# Altium footprint library Switches.PcbLib: 117 footprints (part 6 of 8)
Each footprint in its own frame and in the unit in brackets; x right, y up, seen from the top. Pads: shape width x height; smd on the part's side, far side on the other; paste and mask are expansions set on the pad; w line width, h text height; cw(c..) or ccw(c..) is an arc to the next point about the centre after c.
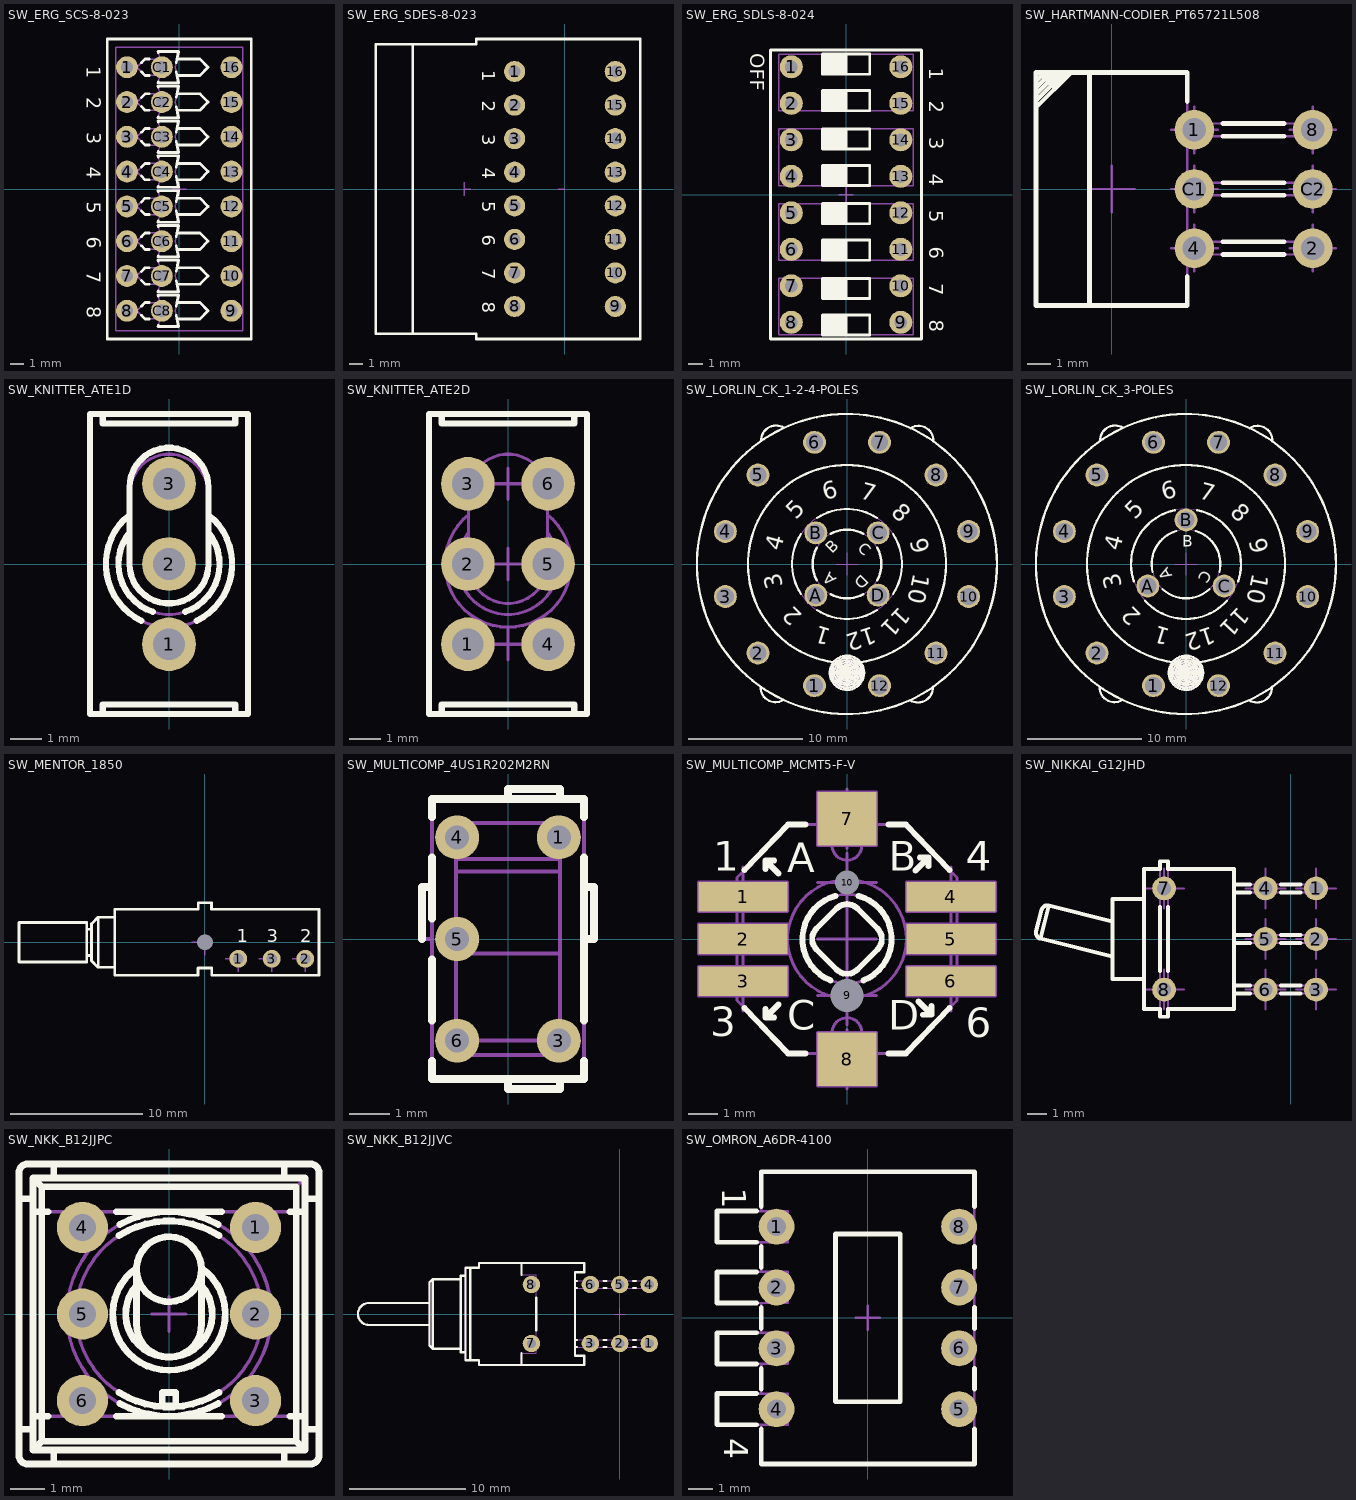
[diagram p5: the footprints below, top view; thin cyan lines are the x and y axes]

## SW_ERG_SCS-8-023 [mm] "Body 21.9x10.5mm, Pitch 2.54mm, 8 Way SPDT, Thru Hole DIP Switch, ERG Spectra C-023 Style"
height 9
pads (24):
  round 1.6 hole 0.9: 1(-3.81,8.89) 2(-3.81,6.35) 3(-3.81,3.81) 4(-3.81,1.27) 5(-3.81,-1.27) 6(-3.81,-3.81) 7(-3.81,-6.35) 8(-3.81,-8.89) 9(3.81,-8.89) 10(3.81,-6.35) 11(3.81,-3.81) 12(3.81,-1.27) 13(3.81,1.27) 14(3.81,3.81) 15(3.81,6.35) 16(3.81,8.89) C1(-1.27,8.89) C2(-1.27,6.35) C3(-1.27,3.81) C4(-1.27,1.27) C5(-1.27,-1.27) C6(-1.27,-3.81) C7(-1.27,-6.35) C8(-1.27,-8.89)
Top Overlay:
  lines w0.2: -2.761,-9.219 -2.49,-9.49 -2.192,-9.49 ; -2.761,-8.561 -2.49,-8.29 -2.192,-8.29 ; -2.761,-6.679 -2.49,-6.95 -2.192,-6.95 ; -2.761,-6.021 -2.49,-5.75 -2.192,-5.75 ; -2.761,-4.139 -2.49,-4.41 -2.192,-4.41 ; -2.761,-3.481 -2.49,-3.21 -2.192,-3.21 ; -2.761,-1.599 -2.49,-1.87 -2.192,-1.87 ; -2.761,-0.941 -2.49,-0.67 -2.192,-0.67 ; -2.761,0.941 -2.49,0.67 -2.192,0.67 ; -2.761,1.599 -2.49,1.87 -2.192,1.87 ; -2.761,3.481 -2.49,3.21 -2.192,3.21 ; -2.761,4.139 -2.49,4.41 -2.192,4.41 ; -2.761,6.021 -2.49,5.75 -2.192,5.75 ; -2.761,6.679 -2.49,6.95 -2.192,6.95 ; -2.761,8.561 -2.49,8.29 -2.192,8.29 ; -2.761,9.219 -2.49,9.49 -2.192,9.49 ; -1.532,-9.958 -1.55,-10.04 -0.05,-10.04 -0.225,-9.234 ; -1.532,-7.822 -1.55,-7.74 -0.05,-7.74 -0.225,-8.546 ; -1.532,-7.418 -1.55,-7.5 -0.05,-7.5 -0.225,-6.694 ; -1.532,-5.282 -1.55,-5.2 -0.05,-5.2 -0.225,-6.006 ; -1.532,-4.878 -1.55,-4.96 -0.05,-4.96 -0.225,-4.154 ; -1.532,-2.742 -1.55,-2.66 -0.05,-2.66 -0.225,-3.466 ; -1.532,-2.338 -1.55,-2.42 -0.05,-2.42 -0.225,-1.614 ; -1.532,-0.202 -1.55,-0.12 -0.05,-0.12 -0.225,-0.926 ; -1.532,0.202 -1.55,0.12 -0.05,0.12 -0.225,0.926 ; -1.532,2.338 -1.55,2.42 -0.05,2.42 -0.225,1.614 ; -1.532,2.742 -1.55,2.66 -0.05,2.66 -0.225,3.466 ; -1.532,4.878 -1.55,4.96 -0.05,4.96 -0.225,4.154 ; -1.532,5.282 -1.55,5.2 -0.05,5.2 -0.225,6.006 ; -1.532,7.418 -1.55,7.5 -0.05,7.5 -0.225,6.694 ; -1.532,7.822 -1.55,7.74 -0.05,7.74 -0.225,8.546 ; -1.532,9.958 -1.55,10.04 -0.05,10.04 -0.225,9.234 ; -0.17,-9.49 1.51,-9.49 2.11,-8.89 1.51,-8.29 -0.17,-8.29 ; -0.17,-6.95 1.51,-6.95 2.11,-6.35 1.51,-5.75 -0.17,-5.75 ; -0.17,-4.41 1.51,-4.41 2.11,-3.81 1.51,-3.21 -0.17,-3.21 ; -0.17,-1.87 1.51,-1.87 2.11,-1.27 1.51,-0.67 -0.17,-0.67 ; -0.17,0.67 1.51,0.67 2.11,1.27 1.51,1.87 -0.17,1.87 ; -0.17,3.21 1.51,3.21 2.11,3.81 1.51,4.41 -0.17,4.41 ; -0.17,5.75 1.51,5.75 2.11,6.35 1.51,6.95 -0.17,6.95 ; -0.17,8.29 1.51,8.29 2.11,8.89 1.51,9.49 -0.17,9.49 ; -5.25,-10.95 5.25,-10.95 5.25,10.95 -5.25,10.95 -5.25,-10.95
  text "1" at -6.75,8.977 h1
  text "3" at -6.75,4.151 h1
  text "2" at -6.75,6.691 h1
  text "5" at -6.75,-0.929 h1
  text "4" at -6.75,1.611 h1
  text "6" at -6.75,-3.469 h1
  text "7" at -6.75,-6.009 h1
  text "8" at -6.75,-8.549 h1
Mechanical 8:
  lines w0.1: -4.31,-8.89 -3.81,-8.89 ; -4.31,-6.35 -3.81,-6.35 ; -4.31,-3.81 -3.81,-3.81 ; -4.31,-1.27 -3.81,-1.27 ; -4.31,1.27 -3.81,1.27 ; -4.31,3.81 -3.81,3.81 ; -4.31,6.35 -3.81,6.35 ; -4.31,8.89 -3.81,8.89 ; -3.81,-9.39 -3.81,-8.89 ; -3.81,-8.39 -3.81,-8.89 ; -3.81,-6.85 -3.81,-6.35 ; -3.81,-5.85 -3.81,-6.35 ; -3.81,-4.31 -3.81,-3.81 ; -3.81,-3.31 -3.81,-3.81 ; -3.81,-1.77 -3.81,-1.27 ; -3.81,-0.77 -3.81,-1.27 ; -3.81,0.77 -3.81,1.27 ; -3.81,1.77 -3.81,1.27 ; -3.81,3.31 -3.81,3.81 ; -3.81,4.31 -3.81,3.81 ; -3.81,5.85 -3.81,6.35 ; -3.81,6.85 -3.81,6.35 ; -3.81,8.39 -3.81,8.89 ; -3.81,9.39 -3.81,8.89 ; -3.31,-8.89 -3.81,-8.89 ; -3.31,-6.35 -3.81,-6.35 ; -3.31,-3.81 -3.81,-3.81 ; -3.31,-1.27 -3.81,-1.27 ; -3.31,1.27 -3.81,1.27 ; -3.31,3.81 -3.81,3.81 ; -3.31,6.35 -3.81,6.35 ; -3.31,8.89 -3.81,8.89 ; -1.77,-8.89 -1.27,-8.89 ; -1.77,-6.35 -1.27,-6.35 ; -1.77,-3.81 -1.27,-3.81 ; -1.77,-1.27 -1.27,-1.27 ; -1.77,1.27 -1.27,1.27 ; -1.77,3.81 -1.27,3.81 ; -1.77,6.35 -1.27,6.35 ; -1.77,8.89 -1.27,8.89 ; -1.27,-9.39 -1.27,-8.89 ; -1.27,-8.39 -1.27,-8.89 ; -1.27,-6.85 -1.27,-6.35 ; -1.27,-5.85 -1.27,-6.35 ; -1.27,-4.31 -1.27,-3.81 ; -1.27,-3.31 -1.27,-3.81 ; -1.27,-1.77 -1.27,-1.27 ; -1.27,-0.77 -1.27,-1.27 ; -1.27,0.77 -1.27,1.27 ; -1.27,1.77 -1.27,1.27 ; -1.27,3.31 -1.27,3.81 ; -1.27,4.31 -1.27,3.81 ; -1.27,5.85 -1.27,6.35 ; -1.27,6.85 -1.27,6.35 ; -1.27,8.39 -1.27,8.89 ; -1.27,9.39 -1.27,8.89 ; -0.77,-8.89 -1.27,-8.89 ; -0.77,-6.35 -1.27,-6.35 ; -0.77,-3.81 -1.27,-3.81 ; -0.77,-1.27 -1.27,-1.27 ; -0.77,1.27 -1.27,1.27 ; -0.77,3.81 -1.27,3.81 ; -0.77,6.35 -1.27,6.35 ; -0.77,8.89 -1.27,8.89 ; -0.5,0 0,0 ; 0,-0.5 0,0 ; 0,0.5 0,0 ; 0.5,0 0,0 ; 3.31,-8.89 3.81,-8.89 ; 3.31,-6.35 3.81,-6.35 ; 3.31,-3.81 3.81,-3.81 ; 3.31,-1.27 3.81,-1.27 ; 3.31,1.27 3.81,1.27 ; 3.31,3.81 3.81,3.81 ; 3.31,6.35 3.81,6.35 ; 3.31,8.89 3.81,8.89 ; 3.81,-9.39 3.81,-8.89 ; 3.81,-8.39 3.81,-8.89 ; 3.81,-6.85 3.81,-6.35 ; 3.81,-5.85 3.81,-6.35 ; 3.81,-4.31 3.81,-3.81 ; 3.81,-3.31 3.81,-3.81 ; 3.81,-1.77 3.81,-1.27 ; 3.81,-0.77 3.81,-1.27 ; 3.81,0.77 3.81,1.27 ; 3.81,1.77 3.81,1.27 ; 3.81,3.31 3.81,3.81 ; 3.81,4.31 3.81,3.81 ; 3.81,5.85 3.81,6.35 ; 3.81,6.85 3.81,6.35 ; 3.81,8.39 3.81,8.89 ; 3.81,9.39 3.81,8.89 ; 4.31,-8.89 3.81,-8.89 ; 4.31,-6.35 3.81,-6.35 ; 4.31,-3.81 3.81,-3.81 ; 4.31,-1.27 3.81,-1.27 ; 4.31,1.27 3.81,1.27 ; 4.31,3.81 3.81,3.81 ; 4.31,6.35 3.81,6.35 ; 4.31,8.89 3.81,8.89
Mechanical 14:
  lines w0.1: -1.43,-9.49 -2.49,-9.49 -3.09,-8.89 -2.49,-8.29 -1.43,-8.29 ; -1.43,-6.95 -2.49,-6.95 -3.09,-6.35 -2.49,-5.75 -1.43,-5.75 ; -1.43,-4.41 -2.49,-4.41 -3.09,-3.81 -2.49,-3.21 -1.43,-3.21 ; -1.43,-1.87 -2.49,-1.87 -3.09,-1.27 -2.49,-0.67 -1.43,-0.67 ; -1.43,0.67 -2.49,0.67 -3.09,1.27 -2.49,1.87 -1.43,1.87 ; -1.43,3.21 -2.49,3.21 -3.09,3.81 -2.49,4.41 -1.43,4.41 ; -1.43,5.75 -2.49,5.75 -3.09,6.35 -2.49,6.95 -1.43,6.95 ; -1.43,8.29 -2.49,8.29 -3.09,8.89 -2.49,9.49 -1.43,9.49 ; -0.17,-9.49 1.51,-9.49 2.11,-8.89 1.51,-8.29 -0.17,-8.29 ; -0.17,-6.95 1.51,-6.95 2.11,-6.35 1.51,-5.75 -0.17,-5.75 ; -0.17,-4.41 1.51,-4.41 2.11,-3.81 1.51,-3.21 -0.17,-3.21 ; -0.17,-1.87 1.51,-1.87 2.11,-1.27 1.51,-0.67 -0.17,-0.67 ; -0.17,0.67 1.51,0.67 2.11,1.27 1.51,1.87 -0.17,1.87 ; -0.17,3.21 1.51,3.21 2.11,3.81 1.51,4.41 -0.17,4.41 ; -0.17,5.75 1.51,5.75 2.11,6.35 1.51,6.95 -0.17,6.95 ; -0.17,8.29 1.51,8.29 2.11,8.89 1.51,9.49 -0.17,9.49 ; -5.25,-10.95 5.25,-10.95 5.25,10.95 -5.25,10.95 -5.25,-10.95 ; -4.65,-10.35 4.65,-10.35 4.65,10.35 -4.65,10.35 -4.65,-10.35 ; -1.55,-10.04 -0.05,-10.04 -0.3,-8.89 -0.05,-7.74 -1.55,-7.74 -1.3,-8.89 -1.55,-10.04 ; -1.55,-7.5 -0.05,-7.5 -0.3,-6.35 -0.05,-5.2 -1.55,-5.2 -1.3,-6.35 -1.55,-7.5 ; -1.55,-4.96 -0.05,-4.96 -0.3,-3.81 -0.05,-2.66 -1.55,-2.66 -1.3,-3.81 -1.55,-4.96 ; -1.55,-2.42 -0.05,-2.42 -0.3,-1.27 -0.05,-0.12 -1.55,-0.12 -1.3,-1.27 -1.55,-2.42 ; -1.55,0.12 -0.05,0.12 -0.3,1.27 -0.05,2.42 -1.55,2.42 -1.3,1.27 -1.55,0.12 ; -1.55,2.66 -0.05,2.66 -0.3,3.81 -0.05,4.96 -1.55,4.96 -1.3,3.81 -1.55,2.66 ; -1.55,5.2 -0.05,5.2 -0.3,6.35 -0.05,7.5 -1.55,7.5 -1.3,6.35 -1.55,5.2 ; -1.55,7.74 -0.05,7.74 -0.3,8.89 -0.05,10.04 -1.55,10.04 -1.3,8.89 -1.55,7.74
  text "1" at 3.2,9.052 h1
  text "3" at 3.2,4.226 h1
  text "2" at 3.2,6.766 h1
  text "5" at 3.2,-0.854 h1
  text "4" at 3.2,1.686 h1
  text "6" at 3.2,-3.394 h1
  text "7" at 3.2,-5.934 h1
  text "8" at 3.2,-8.474 h1
3D body "SW_ERG_SCS-8-023.stp": height 9, standoff -3.6, extent -5.25,-10.95 5.25,10.95

## SW_ERG_SDES-8-023 [mm] "Body 22.7x20mm, Pitch 2.54mm, 8 x SPST Right Angled Thru Hole DIP Switch, ERG SDES 023 Style"
height 10.5
pads (16):
  round 1.6 hole 0.9: 1(-3.81,8.89) 2(-3.81,6.35) 3(-3.81,3.81) 4(-3.81,1.27) 5(-3.81,-1.27) 6(-3.81,-3.81) 7(-3.81,-6.35) 8(-3.81,-8.89) 9(3.81,-8.89) 10(3.81,-6.35) 11(3.81,-3.81) 12(3.81,-1.27) 13(3.81,1.27) 14(3.81,3.81) 15(3.81,6.35) 16(3.81,8.89)
Top Overlay:
  lines w0.2: -11.51,-10.95 -11.51,10.95 ; -14.31,-10.95 -14.31,10.95 -6.71,10.95 -6.71,11.35 5.69,11.35 5.69,-11.35 -6.71,-11.35 -6.71,-10.95 -14.31,-10.95
  text "1" at -6.27,8.977 h1
  text "3" at -6.27,4.151 h1
  text "2" at -6.27,6.691 h1
  text "5" at -6.27,-0.929 h1
  text "4" at -6.27,1.611 h1
  text "6" at -6.27,-3.469 h1
  text "7" at -6.27,-6.009 h1
  text "8" at -6.27,-8.549 h1
Mechanical 8:
  lines w0.1: -7.62,-0.5 -7.62,0 ; -7.62,0.5 -7.62,0 ; -7.12,0 -7.62,0 ; -4.31,-8.89 -3.81,-8.89 ; -4.31,-6.35 -3.81,-6.35 ; -4.31,-3.81 -3.81,-3.81 ; -4.31,-1.27 -3.81,-1.27 ; -4.31,1.27 -3.81,1.27 ; -4.31,3.81 -3.81,3.81 ; -4.31,6.35 -3.81,6.35 ; -4.31,8.89 -3.81,8.89 ; -3.81,-9.39 -3.81,-8.89 ; -3.81,-8.39 -3.81,-8.89 ; -3.81,-6.85 -3.81,-6.35 ; -3.81,-5.85 -3.81,-6.35 ; -3.81,-4.31 -3.81,-3.81 ; -3.81,-3.31 -3.81,-3.81 ; -3.81,-1.77 -3.81,-1.27 ; -3.81,-0.77 -3.81,-1.27 ; -3.81,0.77 -3.81,1.27 ; -3.81,1.77 -3.81,1.27 ; -3.81,3.31 -3.81,3.81 ; -3.81,4.31 -3.81,3.81 ; -3.81,5.85 -3.81,6.35 ; -3.81,6.85 -3.81,6.35 ; -3.81,8.39 -3.81,8.89 ; -3.81,9.39 -3.81,8.89 ; -3.31,1.27 -3.81,1.27 ; -0.5,0 0,0 ; 3.31,-8.89 3.81,-8.89 ; 3.31,-6.35 3.81,-6.35 ; 3.31,-3.81 3.81,-3.81 ; 3.31,-1.27 3.81,-1.27 ; 3.31,1.27 3.81,1.27 ; 3.31,3.81 3.81,3.81 ; 3.31,6.35 3.81,6.35 ; 3.31,8.89 3.81,8.89 ; 3.81,-9.39 3.81,-8.89 ; 3.81,-8.39 3.81,-8.89 ; 3.81,-6.85 3.81,-6.35 ; 3.81,-5.85 3.81,-6.35 ; 3.81,-4.31 3.81,-3.81 ; 3.81,-3.31 3.81,-3.81 ; 3.81,-1.77 3.81,-1.27 ; 3.81,-0.77 3.81,-1.27 ; 3.81,0.77 3.81,1.27 ; 3.81,1.77 3.81,1.27 ; 3.81,3.31 3.81,3.81 ; 3.81,4.31 3.81,3.81 ; 3.81,5.85 3.81,6.35 ; 3.81,6.85 3.81,6.35 ; 3.81,8.39 3.81,8.89 ; 3.81,9.39 3.81,8.89 ; 4.31,-8.89 3.81,-8.89 ; 4.31,-6.35 3.81,-6.35 ; 4.31,-3.81 3.81,-3.81 ; 4.31,-1.27 3.81,-1.27 ; 4.31,1.27 3.81,1.27 ; 4.31,3.81 3.81,3.81 ; 4.31,6.35 3.81,6.35 ; 4.31,8.89 3.81,8.89 ; -3.81,-8.89 -3.31,-8.89 -3.81,-8.89 ; -3.81,-6.35 -3.31,-6.35 -3.81,-6.35 ; -3.81,-3.81 -3.31,-3.81 -3.81,-3.81 ; -3.81,-1.27 -3.31,-1.27 -3.81,-1.27 ; -3.81,3.81 -3.31,3.81 -3.81,3.81 ; -3.81,6.35 -3.31,6.35 -3.81,6.35 ; -3.81,8.89 -3.31,8.89 -3.81,8.89
Mechanical 14:
  lines w0.1: -11.51,10.95 -11.476,-10.95 ; -14.31,-10.95 -14.31,10.95 -6.71,10.95 -6.71,11.35 5.69,11.35 5.69,-11.35 -6.71,-11.35 -6.71,-10.95 -14.31,-10.95
  text "1" at -6.274,8.975 h1
  text "3" at -6.274,4.149 h1
  text "2" at -6.274,6.689 h1
  text "5" at -6.274,-0.931 h1
  text "4" at -6.274,1.609 h1
  text "6" at -6.274,-3.471 h1
  text "7" at -6.274,-6.011 h1
  text "8" at -6.274,-8.551 h1
3D body "SW_ERG_SDES-8-023.stp": height 12.1, standoff -3.6, extent -14.31,-11.35 5.69,11.35

## SW_ERG_SDLS-8-024 [mm] "Body 20.1x10.5mm, Pitch 2.54mm, 8 Way SPST, Thru Hole DIP Switch, ERG 014 Serie"
height 6.8
pads (16):
  round 1.6 hole 0.9: 1(-3.81,8.89) 2(-3.81,6.35) 3(-3.81,3.81) 4(-3.81,1.27) 5(-3.81,-1.27) 6(-3.81,-3.81) 7(-3.81,-6.35) 8(-3.81,-8.89) 9(3.81,-8.89) 10(3.81,-6.35) 11(3.81,-3.81) 12(3.81,-1.27) 13(3.81,1.27) 14(3.81,3.81) 15(3.81,6.35) 16(3.81,8.89)
Top Overlay:
  lines w0.2: -1.6,-9.77 -1.6,-8.37 ; -1.6,-7.23 -1.6,-5.83 ; -1.6,-4.57 -1.6,-3.17 ; -1.6,-2.03 -1.6,-0.63 ; -1.6,0.63 -1.6,2.03 ; -1.6,3.17 -1.6,4.57 ; -1.6,5.83 -1.6,7.23 ; -1.6,8.37 -1.6,9.77 ; -1.4,-9.77 -1.4,-8.37 ; -1.4,-7.23 -1.4,-5.83 ; -1.4,-4.57 -1.4,-3.17 ; -1.4,-2.03 -1.4,-0.63 ; -1.4,0.63 -1.4,2.03 ; -1.4,3.17 -1.4,4.57 ; -1.4,5.83 -1.4,7.23 ; -1.4,8.37 -1.4,9.77 ; -1.2,-9.77 -1.2,-8.37 ; -1.2,-7.23 -1.2,-5.83 ; -1.2,-4.57 -1.2,-3.17 ; -1.2,-2.03 -1.2,-0.63 ; -1.2,0.63 -1.2,2.03 ; -1.2,3.17 -1.2,4.57 ; -1.2,5.83 -1.2,7.23 ; -1.2,8.37 -1.2,9.77 ; -1,-9.77 -1,-8.37 ; -1,-7.23 -1,-5.83 ; -1,-4.57 -1,-3.17 ; -1,-2.03 -1,-0.63 ; -1,0.63 -1,2.03 ; -1,3.17 -1,4.57 ; -1,5.83 -1,7.23 ; -1,8.37 -1,9.77 ; -0.8,-9.77 -0.8,-8.37 ; -0.8,-7.23 -0.8,-5.83 ; -0.8,-4.57 -0.8,-3.17 ; -0.8,-2.03 -0.8,-0.63 ; -0.8,0.63 -0.8,2.03 ; -0.8,3.17 -0.8,4.57 ; -0.8,5.83 -0.8,7.23 ; -0.8,8.37 -0.8,9.77 ; -0.6,-9.77 -0.6,-8.37 ; -0.6,-7.23 -0.6,-5.83 ; -0.6,-4.57 -0.6,-3.17 ; -0.6,-2.03 -0.6,-0.63 ; -0.6,0.63 -0.6,2.03 ; -0.6,3.17 -0.6,4.57 ; -0.6,5.83 -0.6,7.23 ; -0.6,8.37 -0.6,9.77 ; -0.4,-9.77 -0.4,-8.37 ; -0.4,-7.23 -0.4,-5.83 ; -0.4,-4.57 -0.4,-3.17 ; -0.4,-2.03 -0.4,-0.63 ; -0.4,0.63 -0.4,2.03 ; -0.4,3.17 -0.4,4.57 ; -0.4,5.83 -0.4,7.23 ; -0.4,8.37 -0.4,9.77 ; -0.2,-9.77 -0.2,-8.37 ; -0.2,-7.23 -0.2,-5.83 ; -0.2,-4.57 -0.2,-3.17 ; -0.2,-2.03 -0.2,-0.63 ; -0.2,0.63 -0.2,2.03 ; -0.2,3.17 -0.2,4.57 ; -0.2,5.83 -0.2,7.23 ; -0.2,8.37 -0.2,9.77 ; 0,-9.77 0,-8.37 ; 0,-7.23 0,-5.83 ; 0,-4.57 0,-3.17 ; 0,-2.03 0,-0.63 ; 0,0.63 0,2.03 ; 0,3.17 0,4.57 ; 0,5.83 0,7.23 ; 0,8.37 0,9.77 ; -5.25,-10.05 5.25,-10.05 5.25,10.05 -5.25,10.05 -5.25,-10.05 ; -1.65,-9.77 -1.65,-8.37 1.65,-8.37 1.65,-9.77 -1.65,-9.77 ; -1.65,-7.23 -1.65,-5.83 1.65,-5.83 1.65,-7.23 -1.65,-7.23 ; -1.65,-4.57 -1.65,-3.17 1.65,-3.17 1.65,-4.57 -1.65,-4.57 ; -1.65,-2.03 -1.65,-0.63 1.65,-0.63 1.65,-2.03 -1.65,-2.03 ; -1.65,0.63 -1.65,2.03 1.65,2.03 1.65,0.63 -1.65,0.63 ; -1.65,3.17 -1.65,4.57 1.65,4.57 1.65,3.17 -1.65,3.17 ; -1.65,5.83 -1.65,7.23 1.65,7.23 1.65,5.83 -1.65,5.83 ; -1.65,8.37 -1.65,9.77 1.65,9.77 1.65,8.37 -1.65,8.37
  text "1" at 5.785,8.818 h1
  text "3" at 5.785,3.992 h1
  text "2" at 5.785,6.532 h1
  text "5" at 5.785,-1.088 h1
  text "4" at 5.785,1.452 h1
  text "6" at 5.785,-3.628 h1
  text "7" at 5.785,-6.168 h1
  text "8" at 5.785,-8.708 h1
  text "OFF" at -6.65,9.825 h1
Mechanical 8:
  lines w0.1: -0.5,0 0,0 ; 0,-0.5 0,0 ; 0,0.5 0,0 ; 0.5,0 0,0
Mechanical 14:
  drawing of 196 lines, arcs and shapes, not listed
  text "1" at 3.2,9.002 h1
  text "3" at 3.2,4.176 h1
  text "2" at 3.2,6.716 h1
  text "5" at 3.2,-0.904 h1
  text "4" at 3.2,1.636 h1
  text "6" at 3.2,-3.444 h1
  text "7" at 3.2,-5.984 h1
  text "8" at 3.2,-8.524 h1
3D body "ERG_SDLS-8-024.stp": height 6.8, standoff -3.6, extent -5.25,-10.1 5.25,10

## SW_HARTMANN-CODIER_PT65721L508 [mm] "Body 10x10mm, Decimal Code 4 Positions Through Hole Right Angled Rotary Switch with Cross-Shaped Slot Actuator, PT65 Series"
height 10
pads (6):
  round 1.7 hole 1: 1(3.55,2.54) 2(8.63,-2.54) 4(3.55,-2.54) 8(8.63,2.54) C1(3.55,0) C2(8.63,0)
Top Overlay:
  lines w0.2: -3.25,3.5 -1.75,5 ; -3.25,3.783 -2.033,5 ; -3.25,4.066 -2.316,5 ; -3.25,4.349 -2.599,5 ; -3.25,4.631 -2.881,5 ; -3.25,4.914 -3.164,5 ; -0.95,-5 -0.95,5 ; 3.25,-3.753 3.25,-5 -3.25,-5 -3.25,5 3.25,5 3.25,3.753 ; 4.769,-2.815 7.411,-2.815 ; 4.769,-2.265 7.411,-2.265 ; 4.769,-0.275 7.411,-0.275 ; 4.769,0.275 7.411,0.275 ; 4.769,2.265 7.411,2.265 ; 4.769,2.815 7.411,2.815
Mechanical 8:
  lines w0.1: -1,0 0,0 ; 0,-1 0,0 ; 0,1 0,0 ; 1,0 0,0 ; 2.55,-2.54 3.55,-2.54 ; 2.55,0 3.55,0 ; 2.55,2.54 3.55,2.54 ; 3.55,-3.54 3.55,-2.54 ; 3.55,-1.54 3.55,-2.54 ; 3.55,-1 3.55,0 ; 3.55,1 3.55,0 ; 3.55,1.54 3.55,2.54 ; 3.55,3.54 3.55,2.54 ; 4.55,-2.54 3.55,-2.54 ; 4.55,0 3.55,0 ; 4.55,2.54 3.55,2.54 ; 7.63,-2.54 8.63,-2.54 ; 7.63,0 8.63,0 ; 7.63,2.54 8.63,2.54 ; 8.63,-3.54 8.63,-2.54 ; 8.63,-1.54 8.63,-2.54 ; 8.63,-1 8.63,0 ; 8.63,1 8.63,0 ; 8.63,1.54 8.63,2.54 ; 8.63,3.54 8.63,2.54 ; 9.63,-2.54 8.63,-2.54 ; 9.63,0 8.63,0 ; 9.63,2.54 8.63,2.54
Mechanical 14:
  lines w0.1: -3.25,3.5 -1.75,5 ; -3.25,3.783 -2.033,5 ; -3.25,4.066 -2.316,5 ; -3.25,4.349 -2.599,5 ; -3.25,4.631 -2.881,5 ; -3.25,4.914 -3.164,5 ; -0.95,-5 -0.95,5 ; 3.25,-2.815 8.765,-2.815 8.765,-2.265 3.25,-2.265 ; 3.25,-0.275 8.765,-0.275 8.765,0.275 3.25,0.275 ; 3.25,2.265 8.765,2.265 8.765,2.815 3.25,2.815 ; -3.25,-5 3.25,-5 3.25,5 -3.25,5 -3.25,-5
3D body "SW_HARTMANN-CODIER_PT65721L508.stp": height 10, standoff -3.6, extent -3.25,-5 8.765,5

## SW_KNITTER_ATE1D [mm] "Body 9.5x5mm, Toggle SPDT Switch - Vertical PCB Mounting, KNITTER ATE Series"
height 18
pads (3):
  round 1.7 hole 1: 1(0,-2.54) 2(0,0) 3(0,2.54)
Top Overlay:
  lines w0.2: -2.1,-4.75 -2.1,-4.45 2.1,-4.45 2.1,-4.75 ; -2.1,4.75 -2.1,4.45 2.1,4.45 2.1,4.75 ; -1.25,0.999 ccw(c0,0) -0.519,-1.514 ; -1.25,1.561 ccw(c0,0) -0.878,-1.797 ; 0.519,-1.514 ccw(c0,0) 1.25,0.999 ; 0.878,-1.797 ccw(c0,0) 1.25,1.561 ; -2.5,-4.75 -2.5,4.75 2.5,4.75 2.5,-4.75 -2.5,-4.75 ; -1.25,0 ccw(c0,0) 1.25,0 1.25,2.43 ccw(c0,2.43) -1.25,2.43 -1.25,0
Mechanical 8:
  lines w0.1: -0.5,-2.54 0,-2.54 ; -0.5,0 0,0 ; -0.5,2.54 0,2.54 ; 0,-3.04 0,-2.54 ; 0,-2.04 0,-2.54 ; 0,-0.5 0,0 ; 0,0.5 0,0 ; 0,2.04 0,2.54 ; 0,3.04 0,2.54 ; 0.5,-2.54 0,-2.54 ; 0.5,0 0,0 ; 0.5,2.54 0,2.54
Mechanical 14:
  lines w0.1: -2.1,-4.75 -2.1,-4.45 2.1,-4.45 2.1,-4.75 ; -2.1,4.75 -2.1,4.45 2.1,4.45 2.1,4.75 ; -1.25,0.999 ccw(c0,0) 1.25,0.999 ; -1.25,1.561 ccw(c0,0) 1.25,1.561 ; -2.5,-4.75 -2.5,4.75 2.5,4.75 2.5,-4.75 -2.5,-4.75 ; -1.25,0 ccw(c0,0) 1.25,0 1.25,2.23 ccw(c0,2.23) -1.25,2.23 -1.25,0
3D body "SW_KNITTER_ATE1D.stp": height 17.44, standoff -3.3, extent -2.5,-4.75 2.5,4.75

## SW_KNITTER_ATE2D [mm] "Body 9.5x5mm, Toggle DPDT Switch - Vertical PCB Mounting, KNITTER ATE Series"
height 18
pads (6):
  round 1.7 hole 1: 1(-1.27,-2.54) 2(-1.27,0) 3(-1.27,2.54) 4(1.27,-2.54) 5(1.27,0) 6(1.27,2.54)
Top Overlay:
  lines w0.2: -2.1,-4.75 -2.1,-4.45 2.1,-4.45 2.1,-4.75 ; -2.1,4.75 -2.1,4.45 2.1,4.45 2.1,4.75 ; -2.5,-4.75 -2.5,4.75 2.5,4.75 2.5,-4.75 -2.5,-4.75
Mechanical 8:
  lines w0.1: -0.5,-2.54 0,-2.54 ; -0.5,0 0,0 ; -0.5,2.54 0,2.54 ; 0,-3.04 0,-2.54 ; 0,-2.04 0,-2.54 ; 0,-0.5 0,0 ; 0,0.5 0,0 ; 0,2.04 0,2.54 ; 0,3.04 0,2.54 ; 0.5,-2.54 0,-2.54 ; 0.5,0 0,0 ; 0.5,2.54 0,2.54
Mechanical 14:
  lines w0.1: -2.1,-4.75 -2.1,-4.45 2.1,-4.45 2.1,-4.75 ; -2.1,4.75 -2.1,4.45 2.1,4.45 2.1,4.75 ; -1.25,0.999 ccw(c0,0) 1.25,0.999 ; -1.25,1.561 ccw(c0,0) 1.25,1.561 ; -2.5,-4.75 -2.5,4.75 2.5,4.75 2.5,-4.75 -2.5,-4.75 ; -1.25,0 ccw(c0,0) 1.25,0 1.25,2.23 ccw(c0,2.23) -1.25,2.23 -1.25,0
3D body "SW_KNITTER_ATE2D.stp": height 17.44, standoff -3.3, extent -2.5,-4.75 2.5,4.75

## SW_LORLIN_CK_1-2-4-POLES [mm] "1 Pole 12 Ways, Or 2 Poles 6 Ways, Or 4 Poles 3 Ways, Rotary Switch, LORLIN CK Serie"
height 68.1
pads (16):
  round 2 hole 1.5: 1(-2.847,-10.625) 2(-7.778,-7.778) 3(-10.625,-2.847) 4(-10.625,2.847) 5(-7.778,7.778) 6(-2.847,10.625) 7(2.847,10.625) 8(7.778,7.778) 9(10.625,2.847) 10(10.625,-2.847) 11(7.778,-7.778) 12(2.847,-10.625) A(-2.722,-2.722) B(-2.722,2.722) C(2.722,2.722) D(2.722,-2.722)
Top Overlay:
  circle w0.2: c0,-9.5 r0.9
  circle w0.2: c0,-9.5 r1.1
  circle w0.2: c0,-9.5 r1.5
  circle w0.2: c0,-9.5 r0.1
  circle w0.2: c0,-9.5 r0.5
  circle w0.2: c0,-9.5 r1.3
  circle w0.2: c0,-9.5 r0.7
  circle w0.2: c0,-9.5 r0.3
  circle w0.2: c0,0 r13.1
  lines w0.2: -7.548,-10.707 ccw(c-6.249,-10.768) -5.552,-11.865 ; -7.5,10.741 cw(c-6.201,10.796) -5.499,11.89 ; -4.019,-2.625 cw(c0,0) -4.019,2.625 ; -2.64,-1.425 cw(c0,0) -2.64,1.425 ; -2.625,-4.019 ccw(c0,0) 2.625,-4.019 ; -2.625,4.019 cw(c0,0) 2.625,4.019 ; -1.425,-2.64 ccw(c0,0) 1.425,-2.64 ; -1.425,2.64 cw(c0,0) 1.425,2.64 ; -1.177,-8.57 cw(c0,0) 1.177,-8.57 ; 2.64,-1.425 ccw(c0,0) 2.64,1.425 ; 4.019,-2.625 ccw(c0,0) 4.019,2.625 ; 5.499,-11.89 ccw(c6.201,-10.796) 7.5,-10.741 ; 5.552,11.865 cw(c6.249,10.768) 7.548,10.707
  text "B" at -1.299,0.833 h1
  text "C" at 0.833,1.299 h1
  text "D" at 1.299,-0.833 h1
  text "A" at -0.833,-1.299 h1
  text "6" at -1.958,5.547 h1.5
  text "5" at -4.469,3.825 h1.5
  text "4" at -5.783,1.078 h1.5
  text "3" at -5.547,-1.958 h1.5
  text "2" at -3.825,-4.469 h1.5
  text "1" at -1.279,-5.742 h1.5
  text "12" at 2.245,-5.437 h1.5
  text "11" at 4.6,-3.666 h1.5
  text "10" at 5.831,-0.774 h1.5
  text "9" at 5.497,2.044 h1.5
  text "8" at 3.788,4.432 h1.5
  text "7" at 1.064,5.733 h1.5
Mechanical 8:
  lines w0.1: -11.591,-3.106 -10.625,-2.847 ; -11.591,3.106 -10.625,2.847 ; -10.884,-1.881 -10.625,-2.847 ; -10.884,1.881 -10.625,2.847 ; -10.366,-3.813 -10.625,-2.847 ; -10.366,3.813 -10.625,2.847 ; -9.659,-2.588 -10.625,-2.847 ; -9.659,2.588 -10.625,2.847 ; -8.485,-8.485 -7.778,-7.778 ; -8.485,-7.071 -7.778,-7.778 ; -8.485,7.071 -7.778,7.778 ; -8.485,8.485 -7.778,7.778 ; -7.071,-8.485 -7.778,-7.778 ; -7.071,-7.071 -7.778,-7.778 ; -7.071,7.071 -7.778,7.778 ; -7.071,8.485 -7.778,7.778 ; -3.813,-10.366 -2.847,-10.625 ; -3.813,10.366 -2.847,10.625 ; -3.429,-3.429 -2.722,-2.722 ; -3.429,-2.015 -2.722,-2.722 ; -3.429,2.015 -2.722,2.722 ; -3.429,3.429 -2.722,2.722 ; -3.106,-11.591 -2.847,-10.625 ; -3.106,11.591 -2.847,10.625 ; -2.588,-9.659 -2.847,-10.625 ; -2.588,9.659 -2.847,10.625 ; -2.015,-3.429 -2.722,-2.722 ; -2.015,-2.015 -2.722,-2.722 ; -2.015,2.015 -2.722,2.722 ; -2.015,3.429 -2.722,2.722 ; -1.881,-10.884 -2.847,-10.625 ; -1.881,10.884 -2.847,10.625 ; -1,0 0,0 ; 0,-1 0,0 ; 0,1 0,0 ; 1,0 0,0 ; 1.881,-10.884 2.847,-10.625 ; 1.881,10.884 2.847,10.625 ; 2.015,-3.429 2.722,-2.722 ; 2.015,-2.015 2.722,-2.722 ; 2.015,2.015 2.722,2.722 ; 2.015,3.429 2.722,2.722 ; 2.588,-9.659 2.847,-10.625 ; 2.588,9.659 2.847,10.625 ; 3.106,-11.591 2.847,-10.625 ; 3.106,11.591 2.847,10.625 ; 3.429,-3.429 2.722,-2.722 ; 3.429,-2.015 2.722,-2.722 ; 3.429,2.015 2.722,2.722 ; 3.429,3.429 2.722,2.722 ; 3.813,-10.366 2.847,-10.625 ; 3.813,10.366 2.847,10.625 ; 7.071,-8.485 7.778,-7.778 ; 7.071,-7.071 7.778,-7.778 ; 7.071,7.071 7.778,7.778 ; 7.071,8.485 7.778,7.778 ; 8.485,-8.485 7.778,-7.778 ; 8.485,-7.071 7.778,-7.778 ; 8.485,7.071 7.778,7.778 ; 8.485,8.485 7.778,7.778 ; 9.659,-2.588 10.625,-2.847 ; 9.659,2.588 10.625,2.847 ; 10.366,-3.813 10.625,-2.847 ; 10.366,3.813 10.625,2.847 ; 10.884,-1.881 10.625,-2.847 ; 10.884,1.881 10.625,2.847 ; 11.591,-3.106 10.625,-2.847 ; 11.591,3.106 10.625,2.847